# Altium footprint library Connectors.PcbLib: 133 footprints (part 2 of 9)
Each footprint in its own frame and in the unit in brackets; x right, y up, seen from the top. Pads: shape width x height; smd on the part's side, far side on the other; paste and mask are expansions set on the pad; w line width, h text height; cw(c..) or ccw(c..) is an arc to the next point about the centre after c.
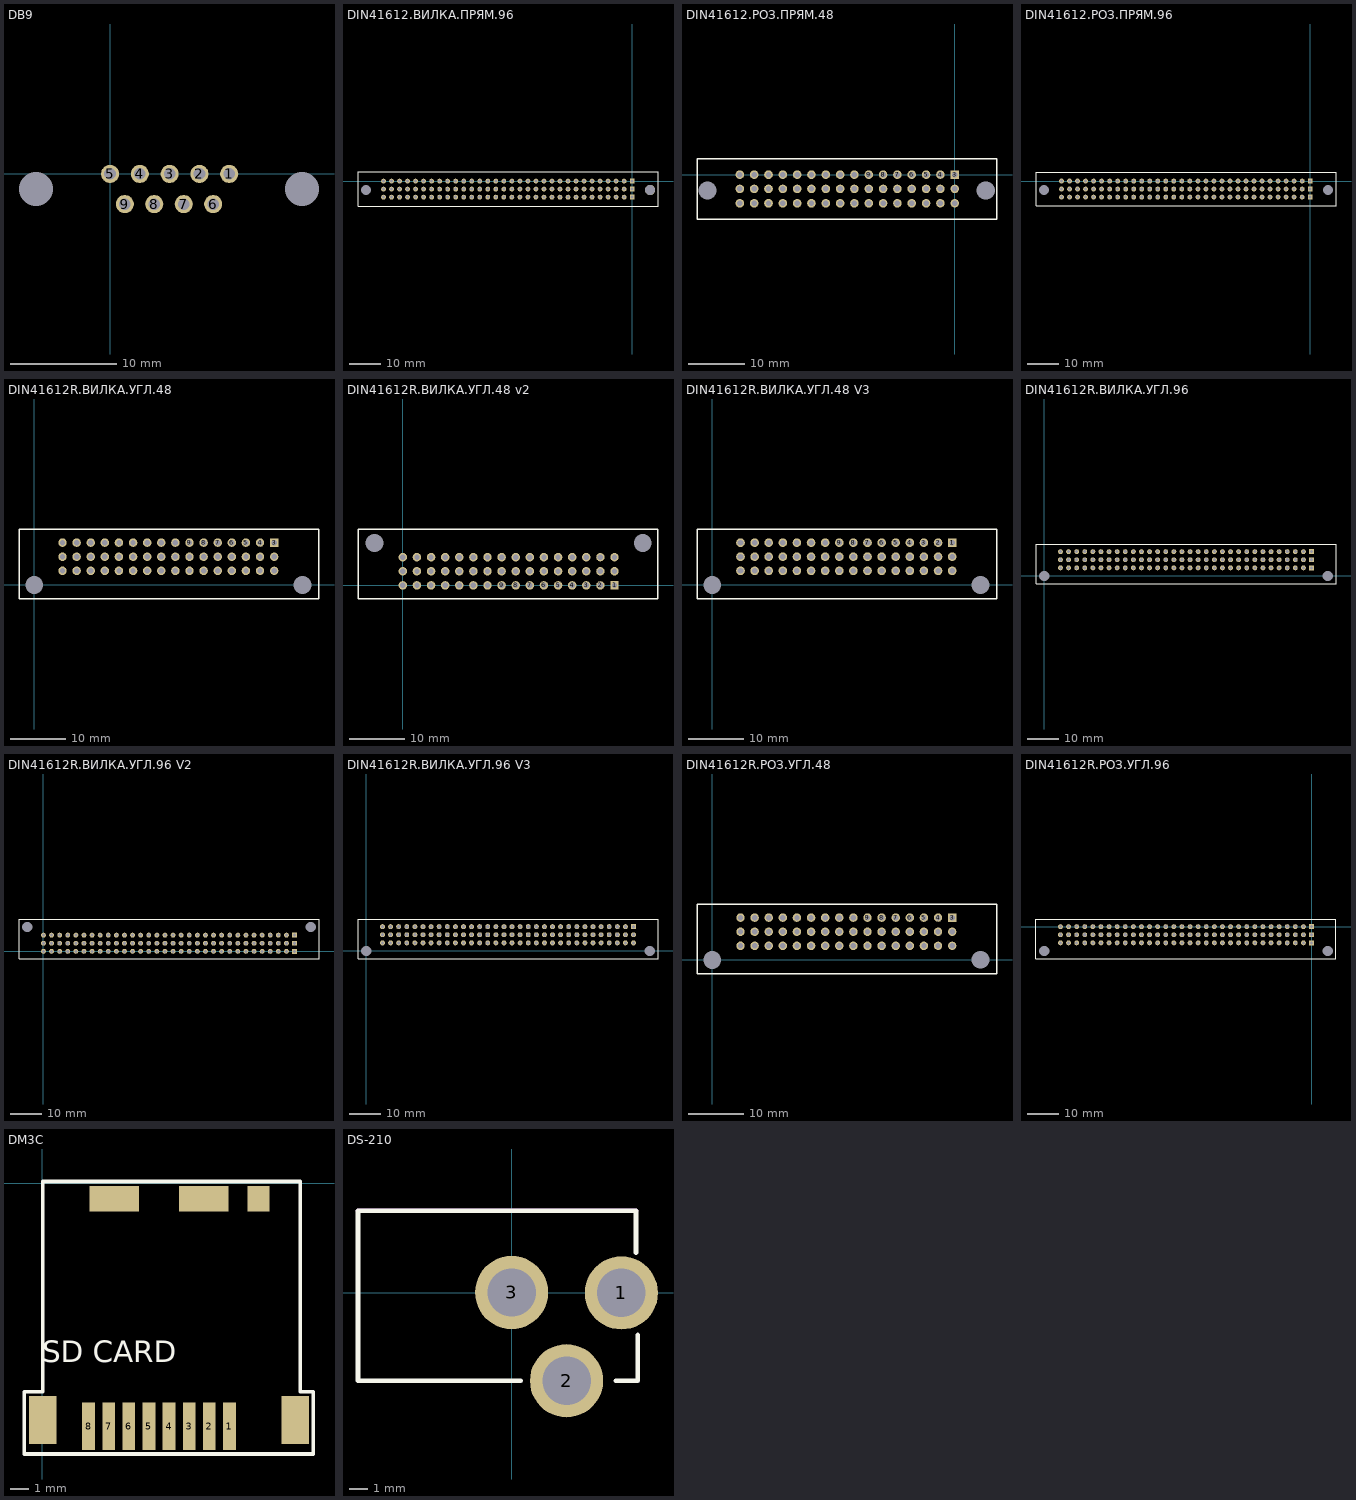
[diagram p1: the footprints below, top view; thin cyan lines are the x and y axes]

## DB9 [mm] "разьем COM232"
pads (11):
  round 1.7 hole 1.1: 1(11.2,0) 2(8.4,0) 3(5.6,0) 4(2.8,0) 5(0,0) 6(9.695,-2.84) 7(6.925,-2.84) 8(4.155,-2.84) 9(1.385,-2.84)
  round 0 hole 3.2 unplated mask+1.7: NPTH(-6.96,-1.42) NPTH(18.04,-1.42)
3D body "db9f-2.step": height 13.28, standoff -3.15, extent -9.791,-16.867 21.009,1.533

## DIN41612.ВИЛКА.ПРЯМ.96 [mil] "3x32 вилка прямая"
pads (98):
  rect 60x60 hole 38: 3(0,0) 35(0,-100) 67(0,-200)
  round 60 hole 38: 4(-100,0) 5(-200,0) 6(-300,0) 7(-400,0) 8(-500,0) 9(-600,0) 10(-700,0) 11(-800,0) 12(-900,0) 13(-1000,0) 14(-1100,0) 15(-1200,0) 16(-1300,0) 17(-1400,0) 18(-1500,0) 19(-1600,0) 20(-1700,0) 21(-1800,0) 22(-1900,0) 23(-2000,0) 24(-2100,0) 25(-2200,0) 26(-2300,0) 27(-2400,0) 28(-2500,0) 29(-2600,0) 30(-2700,0) 31(-2800,0) 32(-2900,0) 33(-3000,0) 34(-3100,0) 36(-100,-100) 37(-200,-100) 38(-300,-100) 39(-400,-100) 40(-500,-100) 41(-600,-100) 42(-700,-100) 43(-800,-100) 44(-900,-100) 45(-1000,-100) 46(-1100,-100) 47(-1200,-100) 48(-1300,-100) 49(-1400,-100) 50(-1500,-100) 51(-1600,-100) 52(-1700,-100) 53(-1800,-100) 54(-1900,-100) 55(-2000,-100) 56(-2100,-100) 57(-2200,-100) 58(-2300,-100) 59(-2400,-100) 60(-2500,-100) 61(-2600,-100) 62(-2700,-100) 63(-2800,-100) 64(-2900,-100) 65(-3000,-100) 66(-3100,-100) 68(-100,-200) 69(-200,-200) 70(-300,-200) 71(-400,-200) 72(-500,-200) 73(-600,-200) 74(-700,-200) 75(-800,-200) 76(-900,-200) 77(-1000,-200) 78(-1100,-200) 79(-1200,-200) 80(-1300,-200) 81(-1400,-200) 82(-1500,-200) 83(-1600,-200) 84(-1700,-200) 85(-1800,-200) 86(-1900,-200) 87(-2000,-200) 88(-2100,-200) 89(-2200,-200) 90(-2300,-200) 91(-2400,-200) 92(-2500,-200) 93(-2600,-200) 94(-2700,-200) 95(-2800,-200) 96(-2900,-200) 97(-3000,-200) 98(-3100,-200)
  round 0 hole 125.98 unplated mask+66.93: NPTH(-3320.75,-110.24)
  round 125.98 hole 125.98 unplated: NPTH(223.62,-110.24)
Top Overlay:
  lines w10: -3418.11,-314.96 322.05,-314.96 322.05,118.11 -3418.11,118.11 -3418.11,-314.96
3D body "96ВИЛКПРЯМ.stp": height 472.44, standoff -230.56, extent -3415.53,-315.14 319.47,118.86

## DIN41612.РОЗ.ПРЯМ.48 [mil] "16x3 розетка прямая"
pads (50):
  rect 60x60 hole 38: 3(0,0)
  round 59.06 hole 38: 4(-100,0) 19(0,-100) 20(-100,-100) 35(0,-200) 36(-100,-200)
  round 60 hole 38: 5(-200,0) 6(-300,0) 7(-400,0) 8(-500,0) 9(-600,0) 10(-700,0) 11(-800,0) 12(-900,0) 13(-1000,0) 14(-1100,0) 15(-1200,0) 16(-1300,0) 17(-1400,0) 18(-1500,0) 21(-200,-100) 22(-300,-100) 23(-400,-100) 24(-500,-100) 25(-600,-100) 26(-700,-100) 27(-800,-100) 28(-900,-100) 29(-1000,-100) 30(-1100,-100) 31(-1200,-100) 32(-1300,-100) 33(-1400,-100) 34(-1500,-100) 37(-200,-200) 38(-300,-200) 39(-400,-200) 40(-500,-200) 41(-600,-200) 42(-700,-200) 43(-800,-200) 44(-900,-200) 45(-1000,-200) 46(-1100,-200) 47(-1200,-200) 48(-1300,-200) 49(-1400,-200) 50(-1500,-200)
  round 0 hole 125.98 unplated mask+66.93: NPTH(-1724.68,-110.24) NPTH(216.81,-110.24)
Top Overlay:
  lines w10: -1799.21,-311.02 -1799.21,110.24 295.28,110.24 295.28,-311.02 -1799.21,-311.02
3D body "48розеткапрямая.stp": height 472.44, standoff -78.35, extent -1799.35,-308.66 295.73,108.66

## DIN41612.РОЗ.ПРЯМ.96 [mil] "32x3 розетка прямая"
pads (98):
  rect 60x60 hole 38: 3(0,0) 35(0,-100) 67(0,-200)
  round 60 hole 38: 4(-100,0) 5(-200,0) 6(-300,0) 7(-400,0) 8(-500,0) 9(-600,0) 10(-700,0) 11(-800,0) 12(-900,0) 13(-1000,0) 14(-1100,0) 15(-1200,0) 16(-1300,0) 17(-1400,0) 18(-1500,0) 19(-1600,0) 20(-1700,0) 21(-1800,0) 22(-1900,0) 23(-2000,0) 24(-2100,0) 25(-2200,0) 26(-2300,0) 27(-2400,0) 28(-2500,0) 29(-2600,0) 30(-2700,0) 31(-2800,0) 32(-2900,0) 33(-3000,0) 34(-3100,0) 36(-100,-100) 37(-200,-100) 38(-300,-100) 39(-400,-100) 40(-500,-100) 41(-600,-100) 42(-700,-100) 43(-800,-100) 44(-900,-100) 45(-1000,-100) 46(-1100,-100) 47(-1200,-100) 48(-1300,-100) 49(-1400,-100) 50(-1500,-100) 51(-1600,-100) 52(-1700,-100) 53(-1800,-100) 54(-1900,-100) 55(-2000,-100) 56(-2100,-100) 57(-2200,-100) 58(-2300,-100) 59(-2400,-100) 60(-2500,-100) 61(-2600,-100) 62(-2700,-100) 63(-2800,-100) 64(-2900,-100) 65(-3000,-100) 66(-3100,-100) 68(-100,-200) 69(-200,-200) 70(-300,-200) 71(-400,-200) 72(-500,-200) 73(-600,-200) 74(-700,-200) 75(-800,-200) 76(-900,-200) 77(-1000,-200) 78(-1100,-200) 79(-1200,-200) 80(-1300,-200) 81(-1400,-200) 82(-1500,-200) 83(-1600,-200) 84(-1700,-200) 85(-1800,-200) 86(-1900,-200) 87(-2000,-200) 88(-2100,-200) 89(-2200,-200) 90(-2300,-200) 91(-2400,-200) 92(-2500,-200) 93(-2600,-200) 94(-2700,-200) 95(-2800,-200) 96(-2900,-200) 97(-3000,-200) 98(-3100,-200)
  round 0 hole 125.98 unplated mask+66.93: NPTH(-3320.75,-110.24) NPTH(223.62,-110.24)
Top Overlay:
  lines w10: -3418.11,-307.87 322.05,-307.87 322.05,109.45 -3418.11,109.45 -3418.11,-307.87
3D body "connector_a-cf96abct.stp": height 472.44, standoff -141.73, extent -3418.11,-307.88 322.05,109.45

## DIN41612/32/ВИЛКА/ПРЯМ [mm] "16х2 вилка прямая"

## DIN41612R.ВИЛКА.УГЛ.48 [mil] "16x3 вилка угловая"
pads (50):
  rect 60x60 hole 38: 3(1700,300)
  round 59.06 hole 38: 4(1600,300) 19(1700,200) 20(1600,200) 35(1700,100) 36(1600,100)
  round 60 hole 38: 5(1500,300) 6(1400,300) 7(1300,300) 8(1200,300) 9(1100,300) 10(1000,300) 11(900,300) 12(800,300) 13(700,300) 14(600,300) 15(500,300) 16(400,300) 17(300,300) 18(200,300) 21(1500,200) 22(1400,200) 23(1300,200) 24(1200,200) 25(1100,200) 26(1000,200) 27(900,200) 28(800,200) 29(700,200) 30(600,200) 31(500,200) 32(400,200) 33(300,200) 34(200,200) 37(1500,100) 38(1400,100) 39(1300,100) 40(1200,100) 41(1100,100) 42(1000,100) 43(900,100) 44(800,100) 45(700,100) 46(600,100) 47(500,100) 48(400,100) 49(300,100) 50(200,100)
  round 0 hole 125.98 unplated mask+66.93: NPTH(0,0) NPTH(1900,0)
Top Overlay:
  lines w10: 2017.72,393.7 2017.72,-98.42 -78.58,-98.42 -108.27,-98.42 -108.27,-88.58 -108.27,395.28 2017.72,395.28
3D body "DIN41612-C-48-M-RA-1.step": height 370.08, standoff -105.32, extent -109.44,-396.06 2012.61,313.47

## DIN41612R.ВИЛКА.УГЛ.48 v2 [mil] "16x3 вилка угловая. нумерация с 1 вывода!!"
pads (50):
  rect 60x60 hole 38: 1(1500,0)
  round 59.06 hole 38: 2(1400,0) 17(1500,100) 18(1400,100) 33(1500,200) 34(1400,200)
  round 60 hole 38: 3(1300,0) 4(1200,0) 5(1100,0) 6(1000,0) 7(900,0) 8(800,0) 9(700,0) 10(600,0) 11(500,0) 12(400,0) 13(300,0) 14(200,0) 15(100,0) 16(0,0) 19(1300,100) 20(1200,100) 21(1100,100) 22(1000,100) 23(900,100) 24(800,100) 25(700,100) 26(600,100) 27(500,100) 28(400,100) 29(300,100) 30(200,100) 31(100,100) 32(0,100) 35(1300,200) 36(1200,200) 37(1100,200) 38(1000,200) 39(900,200) 40(800,200) 41(700,200) 42(600,200) 43(500,200) 44(400,200) 45(300,200) 46(200,200) 47(100,200) 48(0,200)
  round 0 hole 125.98 unplated mask+66.93: NPTH(-200,300) NPTH(1700,300)
Top Overlay:
  lines w10: -317.72,-95.28 1808.27,-95.28 1808.27,388.58 1808.27,398.42 -317.72,398.42 -317.72,-93.7
3D body "DIN41612-C-48-M-RA-1.step": height 370.08, standoff -105.32, extent -312.6,-13.47 1809.44,696.06

## DIN41612R.ВИЛКА.УГЛ.48 V3 [mm] "16x3 вилка угловая"
pads (50):
  rect 1.55x1.55 hole 1: 1(43.18,7.62)
  round 1.55 hole 1: 2(40.64,7.62) 3(38.1,7.62) 4(35.56,7.62) 5(33.02,7.62) 6(30.48,7.62) 7(27.94,7.62) 8(25.4,7.62) 9(22.86,7.62) 10(20.32,7.62) 11(17.78,7.62) 12(15.24,7.62) 13(12.7,7.62) 14(10.16,7.62) 15(7.62,7.62) 16(5.08,7.62) 17(43.18,5.08) 18(40.64,5.08) 19(38.1,5.08) 20(35.56,5.08) 21(33.02,5.08) 22(30.48,5.08) 23(27.94,5.08) 24(25.4,5.08) 25(22.86,5.08) 26(20.32,5.08) 27(17.78,5.08) 28(15.24,5.08) 29(12.7,5.08) 30(10.16,5.08) 31(7.62,5.08) 32(5.08,5.08) 33(43.18,2.54) 34(40.64,2.54) 35(38.1,2.54) 36(35.56,2.54) 37(33.02,2.54) 38(30.48,2.54) 39(27.94,2.54) 40(25.4,2.54) 41(22.86,2.54) 42(20.32,2.54) 43(17.78,2.54) 44(15.24,2.54) 45(12.7,2.54) 46(10.16,2.54) 47(7.62,2.54) 48(5.08,2.54)
  round 0 hole 3.2 unplated mask+1.7: NPTH(0,0) NPTH(48.26,0)
Top Overlay:
  lines w0.254: 51.25,10 51.25,-2.5 -2.75,-2.5 -2.75,-2.25 -2.75,10.04 51.25,10.04
3D body "DIN41612-C-48-M-RA-1.step": height 9.4, standoff -2.68, extent -2.78,-10.06 51.12,7.962

## DIN41612R.ВИЛКА.УГЛ.96 [mil] "32x3 вилка угловая"
pads (98):
  rect 60x60 hole 38: 3(3300,300) 35(3300,200) 67(3300,100)
  round 60 hole 38: 4(3200,300) 5(3100,300) 6(3000,300) 7(2900,300) 8(2800,300) 9(2700,300) 10(2600,300) 11(2500,300) 12(2400,300) 13(2300,300) 14(2200,300) 15(2100,300) 16(2000,300) 17(1900,300) 18(1800,300) 19(1700,300) 20(1600,300) 21(1500,300) 22(1400,300) 23(1300,300) 24(1200,300) 25(1100,300) 26(1000,300) 27(900,300) 28(800,300) 29(700,300) 30(600,300) 31(500,300) 32(400,300) 33(300,300) 34(200,300) 36(3200,200) 37(3100,200) 38(3000,200) 39(2900,200) 40(2800,200) 41(2700,200) 42(2600,200) 43(2500,200) 44(2400,200) 45(2300,200) 46(2200,200) 47(2100,200) 48(2000,200) 49(1900,200) 50(1800,200) 51(1700,200) 52(1600,200) 53(1500,200) 54(1400,200) 55(1300,200) 56(1200,200) 57(1100,200) 58(1000,200) 59(900,200) 60(800,200) 61(700,200) 62(600,200) 63(500,200) 64(400,200) 65(300,200) 66(200,200) 68(3200,100) 69(3100,100) 70(3000,100) 71(2900,100) 72(2800,100) 73(2700,100) 74(2600,100) 75(2500,100) 76(2400,100) 77(2300,100) 78(2200,100) 79(2100,100) 80(2000,100) 81(1900,100) 82(1800,100) 83(1700,100) 84(1600,100) 85(1500,100) 86(1400,100) 87(1300,100) 88(1200,100) 89(1100,100) 90(1000,100) 91(900,100) 92(800,100) 93(700,100) 94(600,100) 95(500,100) 96(400,100) 97(300,100) 98(200,100)
  round 0 hole 125.98 unplated mask+66.93: NPTH(0,0) NPTH(3500,0)
Top Overlay:
  lines w10: -102.36,-98.42 -102.36,393.7 3602.36,393.7 3602.36,-98.42 -102.36,-98.42
3D body "DIN41612-C-96-M-RA-1.step": height 370.08, standoff -105.32, extent -101.57,-395.36 3599.21,314.17

## DIN41612R.ВИЛКА.УГЛ.96 V2 [mil] "32x3 вилка угловая. нумерация с 1 вывода!!"
pads (98):
  rect 60x60 hole 38: 1(3100,0) 33(3100,100) 65(3100,200)
  round 60 hole 38: 2(3000,0) 3(2900,0) 4(2800,0) 5(2700,0) 6(2600,0) 7(2500,0) 8(2400,0) 9(2300,0) 10(2200,0) 11(2100,0) 12(2000,0) 13(1900,0) 14(1800,0) 15(1700,0) 16(1600,0) 17(1500,0) 18(1400,0) 19(1300,0) 20(1200,0) 21(1100,0) 22(1000,0) 23(900,0) 24(800,0) 25(700,0) 26(600,0) 27(500,0) 28(400,0) 29(300,0) 30(200,0) 31(100,0) 32(0,0) 34(3000,100) 35(2900,100) 36(2800,100) 37(2700,100) 38(2600,100) 39(2500,100) 40(2400,100) 41(2300,100) 42(2200,100) 43(2100,100) 44(2000,100) 45(1900,100) 46(1800,100) 47(1700,100) 48(1600,100) 49(1500,100) 50(1400,100) 51(1300,100) 52(1200,100) 53(1100,100) 54(1000,100) 55(900,100) 56(800,100) 57(700,100) 58(600,100) 59(500,100) 60(400,100) 61(300,100) 62(200,100) 63(100,100) 64(0,100) 66(3000,200) 67(2900,200) 68(2800,200) 69(2700,200) 70(2600,200) 71(2500,200) 72(2400,200) 73(2300,200) 74(2200,200) 75(2100,200) 76(2000,200) 77(1900,200) 78(1800,200) 79(1700,200) 80(1600,200) 81(1500,200) 82(1400,200) 83(1300,200) 84(1200,200) 85(1100,200) 86(1000,200) 87(900,200) 88(800,200) 89(700,200) 90(600,200) 91(500,200) 92(400,200) 93(300,200) 94(200,200) 95(100,200) 96(0,200)
  round 0 hole 125.98 unplated mask+66.93: NPTH(-200,300) NPTH(3300,300)
Top Overlay:
  lines w10: -302.36,-93.7 -302.36,398.42 3402.36,398.42 3402.36,-93.7 -302.36,-93.7
3D body "DIN41612-C-96-M-RA-1.step": height 370.08, standoff -105.32, extent -299.21,-14.17 3401.57,695.36

## DIN41612R.ВИЛКА.УГЛ.96 V3 [mm] "32x3 вилка угловая"
pads (98):
  rect 1.55x1.55 hole 1: 1(83.82,7.62)
  round 1.55 hole 1: 2(81.28,7.62) 3(78.74,7.62) 4(76.2,7.62) 5(73.66,7.62) 6(71.12,7.62) 7(68.58,7.62) 8(66.04,7.62) 9(63.5,7.62) 10(60.96,7.62) 11(58.42,7.62) 12(55.88,7.62) 13(53.34,7.62) 14(50.8,7.62) 15(48.26,7.62) 16(45.72,7.62) 17(43.18,7.62) 18(40.64,7.62) 19(38.1,7.62) 20(35.56,7.62) 21(33.02,7.62) 22(30.48,7.62) 23(27.94,7.62) 24(25.4,7.62) 25(22.86,7.62) 26(20.32,7.62) 27(17.78,7.62) 28(15.24,7.62) 29(12.7,7.62) 30(10.16,7.62) 31(7.62,7.62) 32(5.08,7.62) 33(83.82,5.08) 34(81.28,5.08) 35(78.74,5.08) 36(76.2,5.08) 37(73.66,5.08) 38(71.12,5.08) 39(68.58,5.08) 40(66.04,5.08) 41(63.5,5.08) 42(60.96,5.08) 43(58.42,5.08) 44(55.88,5.08) 45(53.34,5.08) 46(50.8,5.08) 47(48.26,5.08) 48(45.72,5.08) 49(43.18,5.08) 50(40.64,5.08) 51(38.1,5.08) 52(35.56,5.08) 53(33.02,5.08) 54(30.48,5.08) 55(27.94,5.08) 56(25.4,5.08) 57(22.86,5.08) 58(20.32,5.08) 59(17.78,5.08) 60(15.24,5.08) 61(12.7,5.08) 62(10.16,5.08) 63(7.62,5.08) 64(5.08,5.08) 65(83.82,2.54) 66(81.28,2.54) 67(78.74,2.54) 68(76.2,2.54) 69(73.66,2.54) 70(71.12,2.54) 71(68.58,2.54) 72(66.04,2.54) 73(63.5,2.54) 74(60.96,2.54) 75(58.42,2.54) 76(55.88,2.54) 77(53.34,2.54) 78(50.8,2.54) 79(48.26,2.54) 80(45.72,2.54) 81(43.18,2.54) 82(40.64,2.54) 83(38.1,2.54) 84(35.56,2.54) 85(33.02,2.54) 86(30.48,2.54) 87(27.94,2.54) 88(25.4,2.54) 89(22.86,2.54) 90(20.32,2.54) 91(17.78,2.54) 92(15.24,2.54) 93(12.7,2.54) 94(10.16,2.54) 95(7.62,2.54) 96(5.08,2.54)
  round 0 hole 3.2 unplated mask+1.7: NPTH(0,0) NPTH(88.9,0)
Top Overlay:
  lines w0.254: -2.6,-2.5 -2.6,10 91.5,10 91.5,-2.5 -2.6,-2.5
3D body "DIN41612-C-96-M-RA-1.step": height 9.4, standoff -2.68, extent -2.58,-10.042 91.42,7.98

## DIN41612R.РОЗ.УГЛ.48 [mil] "16x3 вилка угловая"
pads (50):
  rect 60x60 hole 38: 3(1700,300)
  round 59.06 hole 38: 4(1600,300) 19(1700,200) 20(1600,200) 35(1700,100) 36(1600,100)
  round 60 hole 38: 5(1500,300) 6(1400,300) 7(1300,300) 8(1200,300) 9(1100,300) 10(1000,300) 11(900,300) 12(800,300) 13(700,300) 14(600,300) 15(500,300) 16(400,300) 17(300,300) 18(200,300) 21(1500,200) 22(1400,200) 23(1300,200) 24(1200,200) 25(1100,200) 26(1000,200) 27(900,200) 28(800,200) 29(700,200) 30(600,200) 31(500,200) 32(400,200) 33(300,200) 34(200,200) 37(1500,100) 38(1400,100) 39(1300,100) 40(1200,100) 41(1100,100) 42(1000,100) 43(900,100) 44(800,100) 45(700,100) 46(600,100) 47(500,100) 48(400,100) 49(300,100) 50(200,100)
  round 0 hole 125.98 unplated mask+66.93: NPTH(0,0) NPTH(1901.57,1.57)
Top Overlay:
  lines w10: 2017.72,393.7 2017.72,-98.42 -79.28,-98.42 -108.27,-98.42 -108.27,-88.58 -108.27,395.28 2017.72,395.28
3D body "DIN41612-R-48-F.STEP": height 370.08, standoff -105.32, extent -109.44,-396.06 2012.6,313.47

## DIN41612R.РОЗ.УГЛ.96 [mil] "розетка угловая 32x3"
pads (98):
  rect 60x60 hole 38: 3(0,0) 35(0,-100) 67(0,-200)
  round 60 hole 38: 4(-100,0) 5(-200,0) 6(-300,0) 7(-400,0) 8(-500,0) 9(-600,0) 10(-700,0) 11(-800,0) 12(-900,0) 13(-1000,0) 14(-1100,0) 15(-1200,0) 16(-1300,0) 17(-1400,0) 18(-1500,0) 19(-1600,0) 20(-1700,0) 21(-1800,0) 22(-1900,0) 23(-2000,0) 24(-2100,0) 25(-2200,0) 26(-2300,0) 27(-2400,0) 28(-2500,0) 29(-2600,0) 30(-2700,0) 31(-2800,0) 32(-2900,0) 33(-3000,0) 34(-3100,0) 36(-100,-100) 37(-200,-100) 38(-300,-100) 39(-400,-100) 40(-500,-100) 41(-600,-100) 42(-700,-100) 43(-800,-100) 44(-900,-100) 45(-1000,-100) 46(-1100,-100) 47(-1200,-100) 48(-1300,-100) 49(-1400,-100) 50(-1500,-100) 51(-1600,-100) 52(-1700,-100) 53(-1800,-100) 54(-1900,-100) 55(-2000,-100) 56(-2100,-100) 57(-2200,-100) 58(-2300,-100) 59(-2400,-100) 60(-2500,-100) 61(-2600,-100) 62(-2700,-100) 63(-2800,-100) 64(-2900,-100) 65(-3000,-100) 66(-3100,-100) 68(-100,-200) 69(-200,-200) 70(-300,-200) 71(-400,-200) 72(-500,-200) 73(-600,-200) 74(-700,-200) 75(-800,-200) 76(-900,-200) 77(-1000,-200) 78(-1100,-200) 79(-1200,-200) 80(-1300,-200) 81(-1400,-200) 82(-1500,-200) 83(-1600,-200) 84(-1700,-200) 85(-1800,-200) 86(-1900,-200) 87(-2000,-200) 88(-2100,-200) 89(-2200,-200) 90(-2300,-200) 91(-2400,-200) 92(-2500,-200) 93(-2600,-200) 94(-2700,-200) 95(-2800,-200) 96(-2900,-200) 97(-3000,-200) 98(-3100,-200)
  round 0 hole 125.98 unplated mask+66.93: NPTH(-3300,-300) NPTH(200,-300)
Top Overlay:
  lines w10: -3402.36,-398.42 302.36,-398.42 302.36,93.7 -3402.36,93.7 -3402.36,-398.42
3D body "96РОЗУГЛ.stp": height 366.14, standoff -127.95, extent -3402.28,-699.98 298.51,13.02

## DIN41612R/48/РОЗ/УГЛ [mm] "розетка угловая 16x3"

## DM3C [mm] "Держатель карты MicroSD на плату"
height 1
pads (13):
  rect 0.7x2.6 smd: 1(10.222,-13.288) 2(9.122,-13.288) 3(8.022,-13.288) 4(6.922,-13.288) 5(5.822,-13.288) 6(4.722,-13.288) 7(3.622,-13.288) 8(2.522,-13.288)
  rect 1.5x2.6 smd: ""(0.019,-12.942) ""(13.819,-12.942)
  rect 2.7x1.4 smd: ""(3.919,-0.842) ""(8.819,-0.842)
  rect 1.2x1.4 smd: ""(11.819,-0.842)
Top Overlay:
  lines w0.2: -1,-14.8 -1,-11.4 ; -0.983,-14.8 14.8,-14.8 14.8,-11.4 14.1,-11.4 14.1,0.1 0.019,0.1 0.019,-11.4 ; -0.983,-11.4 0,-11.4
  text "SD CARD" at 0,-10.16 h2
3D body "31785.stp": height 1.98, standoff 0.05, extent 0.3,-14.4 14.1,-0.3

## DS-210 [mm]
pads (3):
  round 4 hole 2.65: 1(6,0) 2(3,-4.8) 3(0,0.025)
Top Overlay:
  lines w0.254: 0.5,-4.8 -8.4,-4.8 -8.4,4.5 6.8,4.5 6.8,2.2 ; 5.7,-4.8 6.9,-4.8 6.9,-2.3
Mechanical 29:
  lines w0.25: -8.4,4.5 6.8,4.5
3D body "PowerJackFemale.STEP": height 11, standoff -3.5, extent -8.55,-4.756 6.75,4.6